# Altium footprint library WR-TBL_Spring Clamp.PcbLib: 258 footprints (part 14 of 17)
Each footprint in its own frame and in the unit in brackets; x right, y up, seen from the top. Pads: shape width x height; smd on the part's side, far side on the other; paste and mask are expansions set on the pad; w line width, h text height; cw(c..) or ccw(c..) is an arc to the next point about the centre after c.
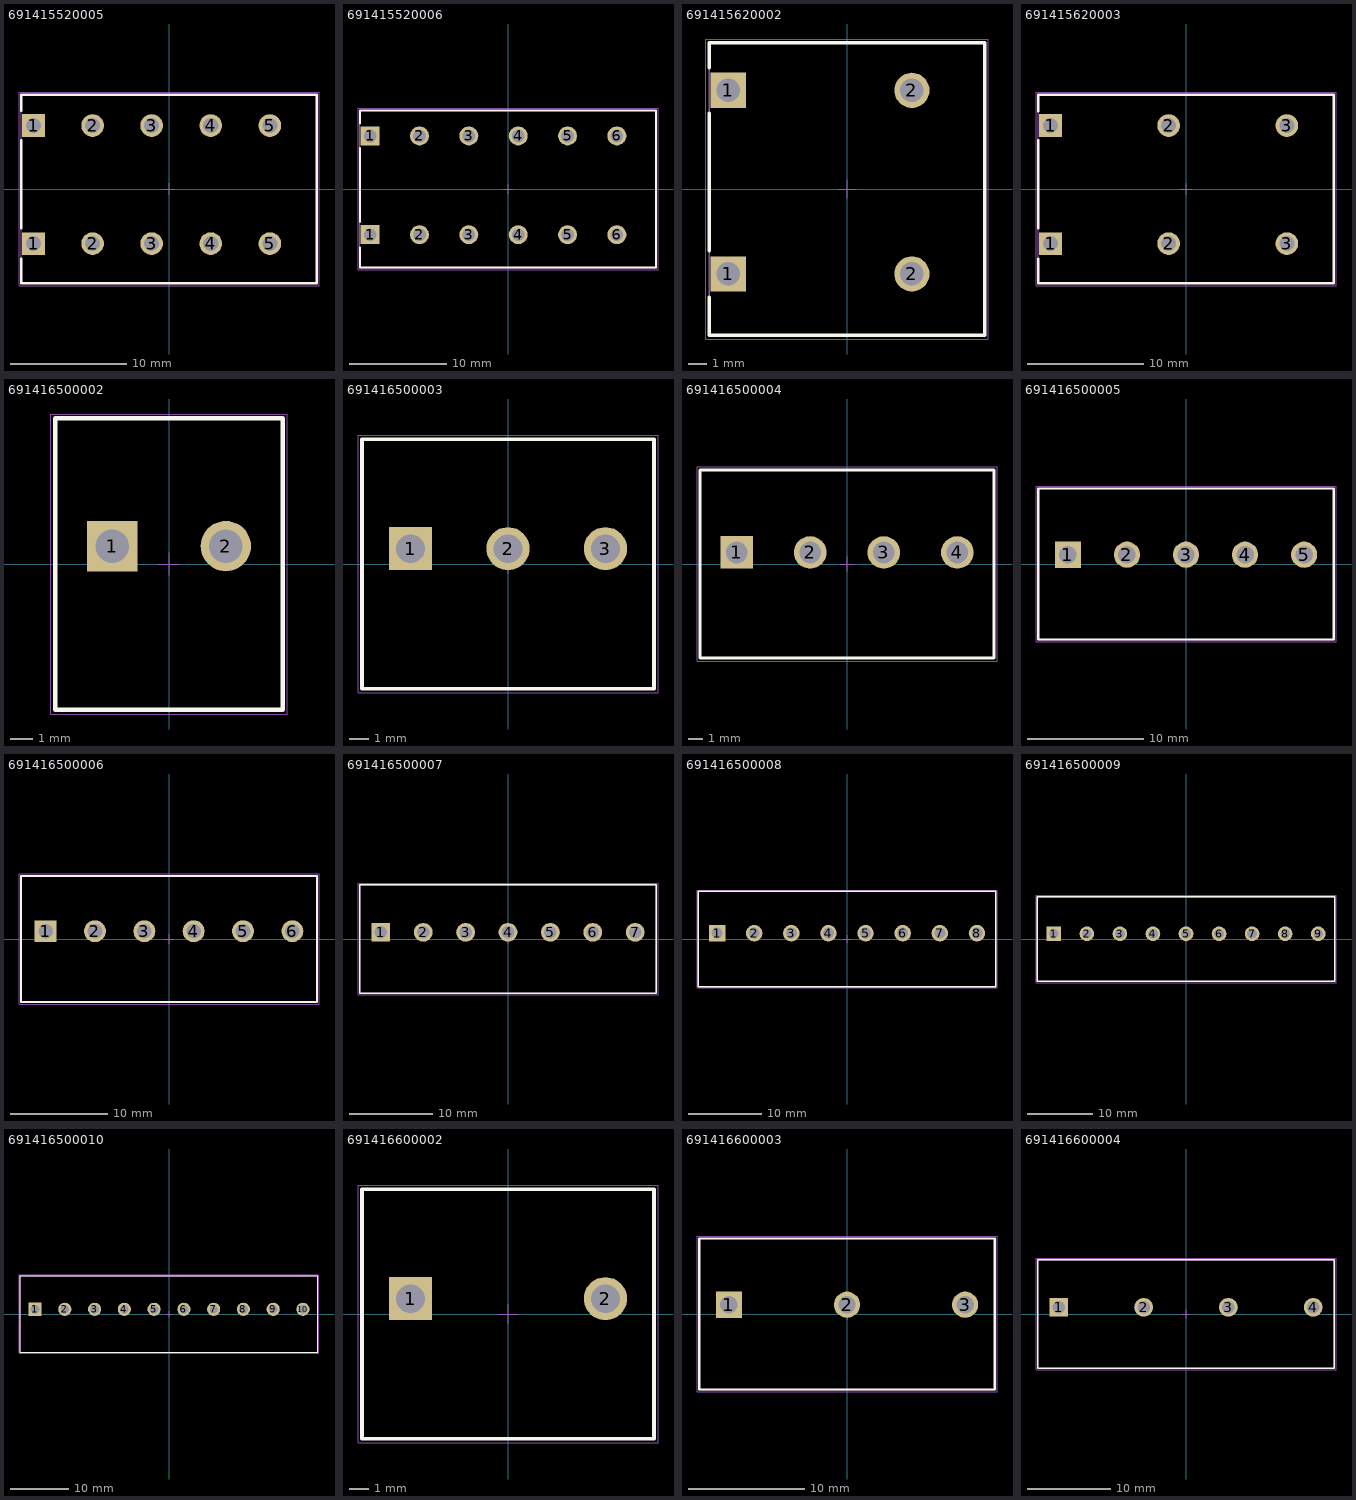
[diagram p13: the footprints below, top view; thin cyan lines are the x and y axes]

## 691415520005 [mm] "5.08 mm Screwless 45° Entry, 5p"
height 13
pads (10):
  rect 1.95x1.95 hole 1.3: 1(-11.65,-4.7) 1(-11.65,5.46)
  round 1.95 hole 1.3: 2(-6.57,-4.7) 2(-6.57,5.46) 3(-1.49,-4.7) 3(-1.49,5.46) 4(3.59,-4.7) 4(3.59,5.46) 5(8.67,-4.7) 5(8.67,5.46)
Top Overlay:
  lines w0.2: -12.7,-6 -12.7,-8.1 12.7,-8.1 12.7,8.1 -12.7,8.1 -12.7,6.72 ; -12.7,-3.4 -12.7,4.2
Mechanical 13:
  lines w0.1: -12.7,-8.1 12.7,-8.1 12.7,8.1 -12.7,8.1 -12.7,-8.1
Mechanical 15:
  lines w0.05: -0.5,0 0.5,0 ; 0,-0.5 0,0.5 ; -12.9,-8.3 12.9,-8.3 12.9,8.3 -12.9,8.3 -12.9,-8.3
3D body "691415520005.stp": height 13.1, standoff -3.4, extent -12.7,-8.1 12.7,8.1

## 691415520006 [mm] "5.08 mm Screwless 45° Entry, 6p"
height 13
pads (12):
  rect 1.95x1.95 hole 1.3: 1(-14.19,-4.7) 1(-14.19,5.46)
  round 1.95 hole 1.3: 2(-9.11,-4.7) 2(-9.11,5.46) 3(-4.03,-4.7) 3(-4.03,5.46) 4(1.05,-4.7) 4(1.05,5.46) 5(6.13,-4.7) 5(6.13,5.46) 6(11.21,-4.7) 6(11.21,5.46)
Top Overlay:
  lines w0.2: -15.24,-6 -15.24,-8.1 15.24,-8.1 15.24,8.1 -15.24,8.1 -15.24,6.72 ; -15.24,-3.4 -15.24,4.2
Mechanical 13:
  lines w0.1: -15.24,-8.1 -15.24,8.1 15.24,8.1 15.24,-8.1 -15.24,-8.1
Mechanical 15:
  lines w0.05: -0.5,0 0.5,0 ; 0,-0.5 0,0.5 ; -15.44,-8.3 -15.44,8.3 15.44,8.3 15.44,-8.3 -15.44,-8.3
3D body "691415520006.stp": height 13.1, standoff -3.4, extent -15.24,-8.1 15.24,8.1

## 691415620002 [mm] "Serie 4156 - 10.16 mm _ 2 pins"
height 13
pads (4):
  rect 1.95x1.95 hole 1.3: 1(-6.57,-4.7) 1(-6.57,5.46)
  round 1.95 hole 1.3: 2(3.59,-4.7) 2(3.59,5.46)
Top Overlay:
  lines w0.2: -7.62,-6 -7.62,-8.1 7.62,-8.1 7.62,8.1 -7.62,8.1 -7.62,6.7 ; -7.62,-3.4 -7.62,4.2
Mechanical 13:
  lines w0.1: -7.62,-8.1 -7.62,8.1 7.62,8.1 7.62,-8.1 -7.62,-8.1
Mechanical 15:
  lines w0.05: -0.5,0 0.5,0 ; 0,-0.5 0,0.5 ; -7.82,-8.3 7.82,-8.3 7.82,8.3 -7.82,8.3 -7.82,-8.3
3D body "691415620002.stp": height 13.05, standoff -3.45, extent -7.62,-8.1 7.62,8.1

## 691415620003 [mm] "Serie 4156 - 10.16 mm _ 3 pins"
height 13
pads (6):
  rect 1.95x1.95 hole 1.3: 1(-11.65,-4.7) 1(-11.65,5.46)
  round 1.95 hole 1.3: 2(-1.49,-4.7) 2(-1.49,5.46) 3(8.67,-4.7) 3(8.67,5.46)
Top Overlay:
  lines w0.2: -12.7,-6 -12.7,-8.1 12.7,-8.1 12.7,8.1 -12.7,8.1 -12.7,6.7 ; -12.7,-3.4 -12.7,4.2
Mechanical 13:
  lines w0.1: -12.7,-8.1 -12.7,8.1 12.7,8.1 12.7,-8.1 -12.7,-8.1
Mechanical 15:
  lines w0.05: -0.5,0 0.5,0 ; 0,-0.5 0,0.5 ; -12.9,-8.3 12.9,-8.3 12.9,8.3 -12.9,8.3 -12.9,-8.3
3D body "691415620003.stp": height 13.05, standoff -3.45, extent -12.7,-8.1 12.7,8.1

## 691416500002 [mm] "5.08 mm Screwless Vertical Entry, 2p"
height 12.5
pads (2):
  rect 2.25x2.25 hole 1.5: 1(-2.54,0.8)
  round 2.25 hole 1.5: 2(2.54,0.8)
Top Overlay:
  lines w0.2: -5.08,-6.5 5.08,-6.5 5.08,6.5 -5.08,6.5 -5.08,-6.5
Mechanical 13:
  lines w0.1: -5.08,-6.5 -5.08,6.5 5.08,6.5 5.08,-6.5 -5.08,-6.5
Mechanical 15:
  lines w0.05: -0.5,0 0.5,0 ; 0,-0.5 0,0.5 ; -5.28,-6.7 5.28,-6.7 5.28,6.7 -5.28,6.7 -5.28,-6.7
3D body "691416500002.stp": height 12.55, standoff -4.95, extent -5.08,-6.5 5.08,6.5

## 691416500003 [mm] "5.08 mm Screwless Vertical Entry, 3p"
height 12.5
pads (3):
  rect 2.25x2.25 hole 1.5: 1(-5.08,0.8)
  round 2.25 hole 1.5: 2(0,0.8) 3(5.08,0.8)
Top Overlay:
  lines w0.2: -7.62,-6.5 7.62,-6.5 7.62,6.5 -7.62,6.5 -7.62,-6.5
Mechanical 13:
  lines w0.1: -7.62,-6.5 -7.62,6.5 7.62,6.5 7.62,-6.5 -7.62,-6.5
Mechanical 15:
  lines w0.05: -0.5,0 0.5,0 ; 0,-0.5 0,0.5 ; -7.82,-6.7 7.82,-6.7 7.82,6.7 -7.82,6.7 -7.82,-6.7
3D body "691416500003.stp": height 12.55, standoff -4.95, extent -7.62,-6.5 7.62,6.5

## 691416500004 [mm] "5.08 mm Screwless Vertical Entry, 4p"
height 12.5
pads (4):
  rect 2.25x2.25 hole 1.5: 1(-7.62,0.8)
  round 2.25 hole 1.5: 2(-2.54,0.8) 3(2.54,0.8) 4(7.62,0.8)
Top Overlay:
  lines w0.2: -10.16,-6.5 -10.16,6.5 10.16,6.5 10.16,-6.5 -10.16,-6.5
Mechanical 13:
  lines w0.1: -10.16,-6.5 10.16,-6.5 10.16,6.5 -10.16,6.5 -10.16,-6.5
Mechanical 15:
  lines w0.05: -0.5,0 0.5,0 ; 0,-0.5 0,0.5 ; -10.36,-6.7 -10.36,6.7 10.36,6.7 10.36,-6.7 -10.36,-6.7
3D body "691416500004.stp": height 12.55, standoff -4.95, extent -10.16,-6.5 10.16,6.5

## 691416500005 [mm] "5.08 mm Screwless Vertical Entry, 5p"
height 12.5
pads (5):
  rect 2.25x2.25 hole 1.5: 1(-10.16,0.8)
  round 2.25 hole 1.5: 2(-5.08,0.8) 3(0,0.8) 4(5.08,0.8) 5(10.16,0.8)
Top Overlay:
  lines w0.2: -12.7,-6.5 12.7,-6.5 12.7,6.5 -12.7,6.5 -12.7,-6.5
Mechanical 13:
  lines w0.1: -12.7,-6.5 -12.7,6.5 12.7,6.5 12.7,-6.5 -12.7,-6.5
Mechanical 15:
  lines w0.05: -0.5,0 0.5,0 ; 0,-0.5 0,0.5 ; -12.9,-6.7 12.9,-6.7 12.9,6.7 -12.9,6.7 -12.9,-6.7
3D body "691416500005.stp": height 12.55, standoff -4.95, extent -12.7,-6.5 12.7,6.5

## 691416500006 [mm] "5.08 mm Screwless Vertical Entry, 6p"
height 12.5
pads (6):
  rect 2.25x2.25 hole 1.5: 1(-12.7,0.8)
  round 2.25 hole 1.5: 2(-7.62,0.8) 3(-2.54,0.8) 4(2.54,0.8) 5(7.62,0.8) 6(12.7,0.8)
Top Overlay:
  lines w0.2: -15.24,-6.5 15.24,-6.5 15.24,6.5 -15.24,6.5 -15.24,-6.5
Mechanical 13:
  lines w0.1: -15.24,-6.5 -15.24,6.5 15.24,6.5 15.24,-6.5 -15.24,-6.5
Mechanical 15:
  lines w0.05: -0.5,0 0.5,0 ; 0,-0.5 0,0.5 ; -15.44,-6.7 15.44,-6.7 15.44,6.7 -15.44,6.7 -15.44,-6.7
3D body "691416500006.stp": height 12.55, standoff -4.95, extent -15.24,-6.5 15.24,6.5

## 691416500007 [mm] "5.08 mm Screwless Vertical Entry, 7p"
height 12.5
pads (7):
  rect 2.25x2.25 hole 1.5: 1(-15.24,0.8)
  round 2.25 hole 1.5: 2(-10.16,0.8) 3(-5.08,0.8) 4(0,0.8) 5(5.08,0.8) 6(10.16,0.8) 7(15.24,0.8)
Top Overlay:
  lines w0.2: -17.78,-6.5 -17.78,6.5 17.78,6.5 17.78,-6.5 -17.78,-6.5
Mechanical 13:
  lines w0.1: -17.78,-6.5 17.78,-6.5 17.78,6.5 -17.78,6.5 -17.78,-6.5
Mechanical 15:
  lines w0.05: -0.5,0 0.5,0 ; 0,-0.5 0,0.5 ; -17.98,-6.7 -17.98,6.7 17.98,6.7 17.98,-6.7 -17.98,-6.7
3D body "691416500007.stp": height 12.55, standoff -4.95, extent -17.78,-6.5 17.78,6.5

## 691416500008 [mm] "5.08 mm Screwless Vertical Entry, 8p"
height 12.5
pads (8):
  rect 2.25x2.25 hole 1.5: 1(-17.78,0.8)
  round 2.25 hole 1.5: 2(-12.7,0.8) 3(-7.62,0.8) 4(-2.54,0.8) 5(2.54,0.8) 6(7.62,0.8) 7(12.7,0.8) 8(17.78,0.8)
Top Overlay:
  lines w0.2: -20.32,-6.5 20.32,-6.5 20.32,6.5 -20.32,6.5 -20.32,-6.5
Mechanical 13:
  lines w0.1: -20.32,-6.5 -20.32,6.5 20.32,6.5 20.32,-6.5 -20.32,-6.5
Mechanical 15:
  lines w0.05: -0.5,0 0.5,0 ; 0,-0.5 0,0.5 ; -20.52,-6.7 20.52,-6.7 20.52,6.7 -20.52,6.7 -20.52,-6.7
3D body "691416500008.stp": height 12.55, standoff -4.95, extent -20.32,-6.5 20.32,6.5

## 691416500009 [mm] "5.08 mm Screwless Vertical Entry, 9p"
height 12.5
pads (9):
  rect 2.25x2.25 hole 1.5: 1(-20.32,0.8)
  round 2.25 hole 1.5: 2(-15.24,0.8) 3(-10.16,0.8) 4(-5.08,0.8) 5(0,0.8) 6(5.08,0.8) 7(10.16,0.8) 8(15.24,0.8) 9(20.32,0.8)
Top Overlay:
  lines w0.2: -22.86,-6.5 -22.86,6.5 22.86,6.5 22.86,-6.5 -22.86,-6.5
Mechanical 13:
  lines w0.1: -22.86,-6.5 22.86,-6.5 22.86,6.5 -22.86,6.5 -22.86,-6.5
Mechanical 15:
  lines w0.05: -0.5,0 0.5,0 ; 0,-0.5 0,0.5 ; -23.06,-6.7 -23.06,6.7 23.06,6.7 23.06,-6.7 -23.06,-6.7
3D body "691416500009.stp": height 12.55, standoff -4.95, extent -22.86,-6.5 22.86,6.5

## 691416500010 [mm] "5.08 mm Screwless Vertical Entry, 10p"
height 12.5
pads (10):
  rect 2.25x2.25 hole 1.5: 1(-22.86,0.8)
  round 2.25 hole 1.5: 2(-17.78,0.8) 3(-12.7,0.8) 4(-7.62,0.8) 5(-2.54,0.8) 6(2.54,0.8) 7(7.62,0.8) 8(12.7,0.8) 9(17.78,0.8) 10(22.86,0.8)
Top Overlay:
  lines w0.2: -25.4,-6.5 25.4,-6.5 25.4,6.5 -25.4,6.5 -25.4,-6.5
Mechanical 13:
  lines w0.1: -25.4,-6.5 -25.4,6.5 25.4,6.5 25.4,-6.5 -25.4,-6.5
Mechanical 15:
  lines w0.05: -0.5,0 0.5,0 ; 0,-0.5 0,0.5 ; -25.6,-6.7 25.6,-6.7 25.6,6.7 -25.6,6.7 -25.6,-6.7
3D body "691416500010.stp": height 12.55, standoff -4.95, extent -25.4,-6.5 25.4,6.5

## 691416600002 [mm] "Serie 4166 - 10.16 mm _ 2 pins"
height 12.5
pads (2):
  rect 2.25x2.25 hole 1.5: 1(-5.08,0.8)
  round 2.25 hole 1.5: 2(5.08,0.8)
Top Overlay:
  lines w0.2: -7.62,-6.5 7.62,-6.5 7.62,6.5 -7.62,6.5 -7.62,-6.5
Mechanical 13:
  lines w0.1: -7.62,-6.5 -7.62,6.5 7.62,6.5 7.62,-6.5 -7.62,-6.5
Mechanical 15:
  lines w0.05: -0.5,0 0.5,0 ; 0,-0.5 0,0.5 ; -7.82,-6.7 7.82,-6.7 7.82,6.7 -7.82,6.7 -7.82,-6.7
3D body "691416600002.stp": height 12.55, standoff -4.95, extent -7.62,-6.5 7.62,6.5

## 691416600003 [mm] "Serie 4166 - 10.16 mm _ 3 pins"
height 12.5
pads (3):
  rect 2.25x2.25 hole 1.5: 1(-10.16,0.8)
  round 2.25 hole 1.5: 2(0,0.8) 3(10.16,0.8)
Top Overlay:
  lines w0.2: -12.7,-6.5 -12.7,6.5 12.7,6.5 12.7,-6.5 -12.7,-6.5
Mechanical 13:
  lines w0.1: -12.7,-6.5 12.7,-6.5 12.7,6.5 -12.7,6.5 -12.7,-6.5
Mechanical 15:
  lines w0.05: -0.5,0 0.5,0 ; 0,-0.5 0,0.5 ; -12.9,-6.7 -12.9,6.7 12.9,6.7 12.9,-6.7 -12.9,-6.7
3D body "691416600003.stp": height 12.55, standoff -4.95, extent -12.7,-6.5 12.7,6.5

## 691416600004 [mm] "Serie 4166 - 10.16 mm _ 4 pins"
height 12.5
pads (4):
  rect 2.25x2.25 hole 1.5: 1(-15.24,0.8)
  round 2.25 hole 1.5: 2(-5.08,0.8) 3(5.08,0.8) 4(15.24,0.8)
Top Overlay:
  lines w0.2: -17.78,-6.5 -17.78,6.5 17.78,6.5 17.78,-6.5 -17.78,-6.5
Mechanical 13:
  lines w0.1: -17.78,-6.5 17.78,-6.5 17.78,6.5 -17.78,6.5 -17.78,-6.5
Mechanical 15:
  lines w0.05: -0.5,0 0.5,0 ; 0,-0.5 0,0.5 ; -17.98,-6.7 -17.98,6.7 17.98,6.7 17.98,-6.7 -17.98,-6.7
3D body "691416600004.stp": height 12.55, standoff -4.95, extent -17.78,-6.5 17.78,6.5